# Altium integrated library GPDSE.IntLib: 634 symbols (part 2 of 7) (continued)
## SN74S112 (continued)
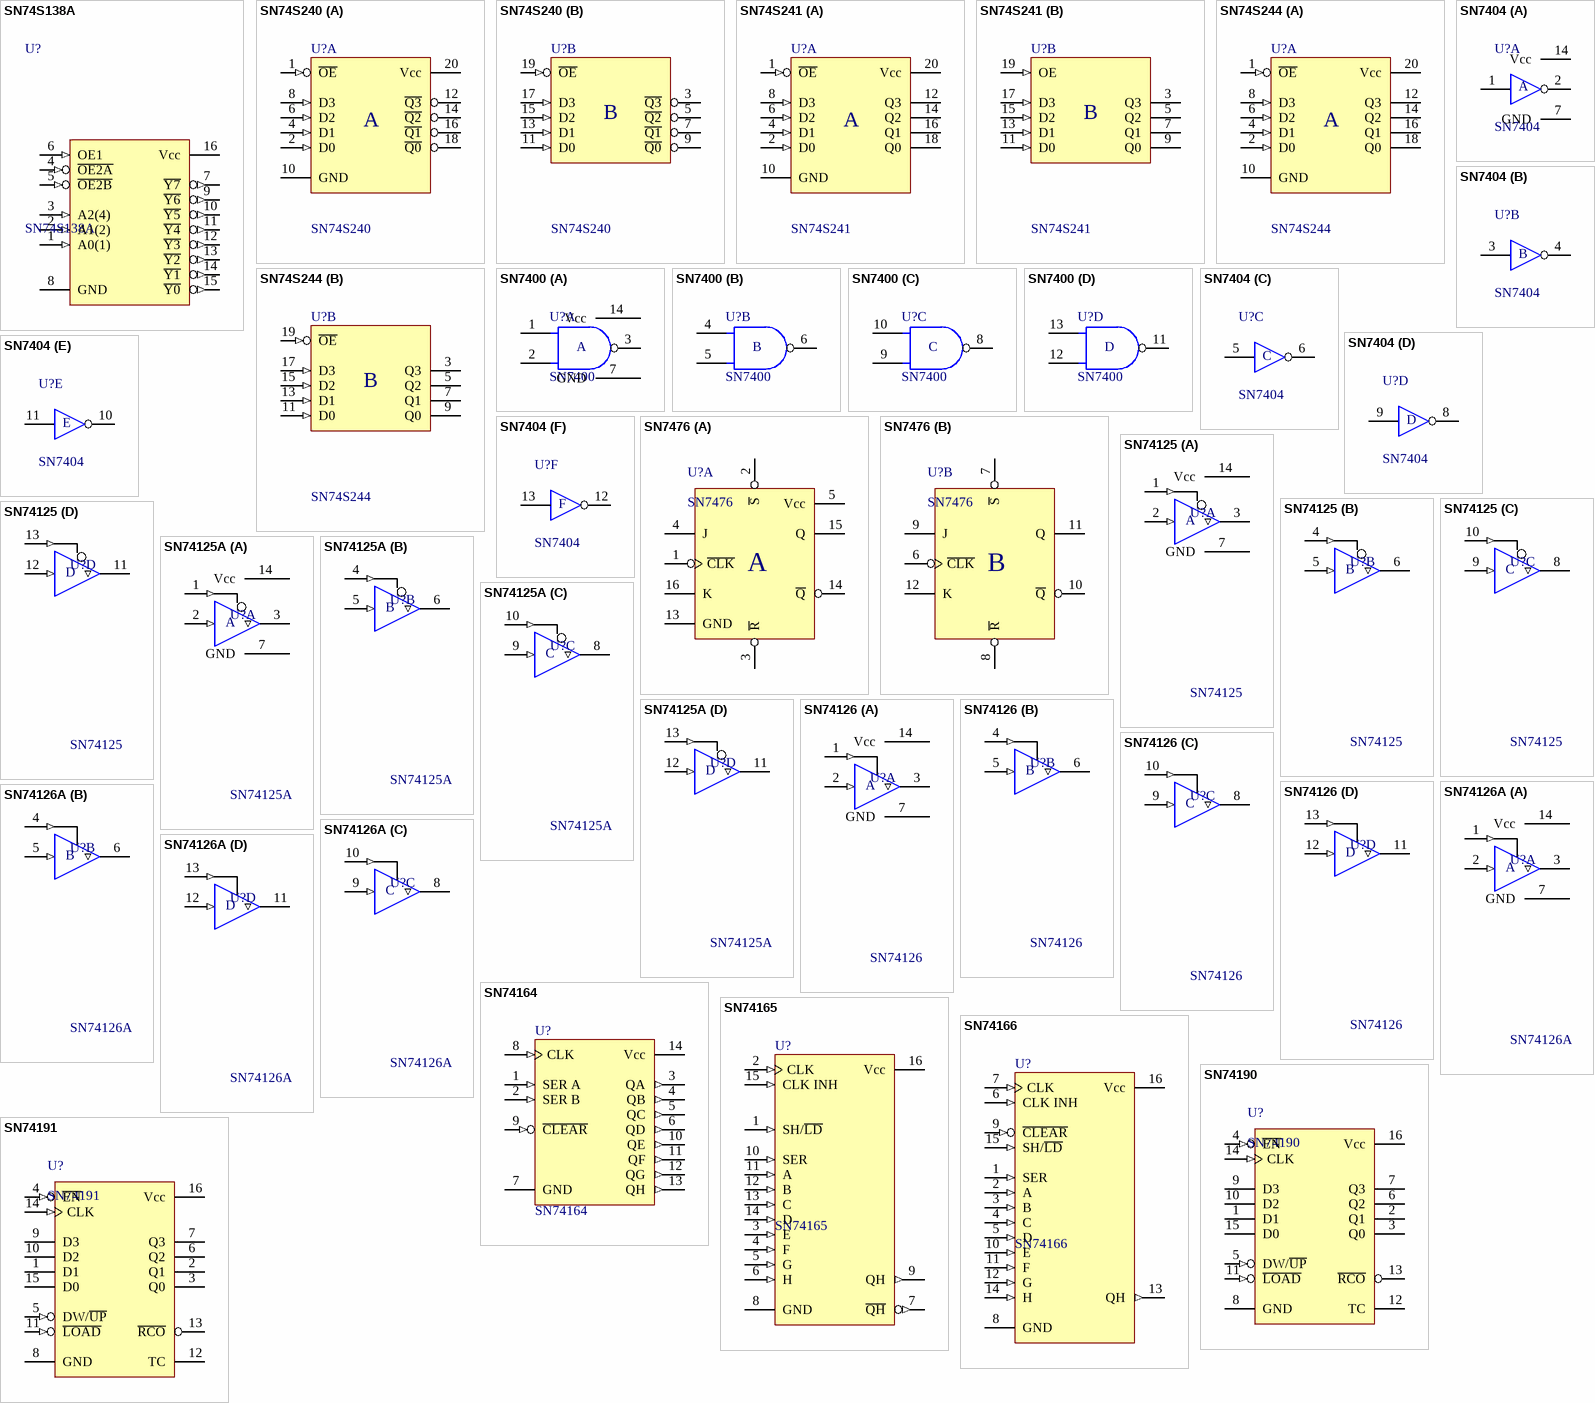
[diagram p6: symbols SN74S138A to SN74191]
part A text: A
part B text: B

## SN74S138A
designator U?
[TI] 3-Line to 8-Line Decoder / Demultiplexer; Output Voltage (Vo): 0 to Vcc; Supply Voltage (Vcc): 4.75 to 5.25 V; Propagation Delay High-Low (tphl): 8ns; Propagation Delay Low-High (tplh): 7.5ns; Output High Current (Ioh): -1 mA; Output Low Current (Iol): 20 mA; Input Voltage (Vi): 0 to Vcc
footprint DIP16-300(100) (Footprint not found)
footprint SOIC16-150(50) (Plastic Small Outline 16 pinos)
pins: 1 A0(1) (in), 2 A1(2) (in), 3 A2(4) (in), 4 ~{OE2A} (in), 5 ~{OE2B} (in), 6 OE1 (in), 7 ~{Y7} (out), 8 GND (power), 9 ~{Y6} (out), 10 ~{Y5} (out), 11 ~{Y4} (out), 12 ~{Y3} (out), 13 ~{Y2} (out), 14 ~{Y1} (out), 15 ~{Y0} (out), 16 Vcc (power)

## SN74S240
designator U?
[TI] Octal Buffer/Driver with 3-State Outputs; Supply Voltage (Vcc): 4.75 to 5.25 V; Input Voltage (Vi): 0 to Vcc; Output High Current (Ioh): -15 mA; Output Low Current (Iol): 64 mA; Propagation Delay (tpd): 10ns; Output Voltage (Vo): 0 to Vcc
footprint SOIC20-300(50) (SOIC 20 Leads; Row Spacing 7.62 mm; Pitch 1.27 mm; 3D André L´Hérault)
footprint DIP20-300(100) (Footprint not found)
part A pins: 1 ~{OE} (in), 2 D0 (in), 4 D1 (in), 6 D2 (in), 8 D3 (in), 10 GND (power), 12 ~{Q3} (hiz), 14 ~{Q2} (hiz), 16 ~{Q1} (hiz), 18 ~{Q0} (hiz), 20 Vcc (power)
part B pins: 3 ~{Q3} (hiz), 5 ~{Q2} (hiz), 7 ~{Q1} (hiz), 9 ~{Q0} (hiz), 11 D0 (in), 13 D1 (in), 15 D2 (in), 17 D3 (in), 19 ~{OE} (in)
part A text: A
part B text: B

## SN74S241
designator U?
[TI] Octal Buffer/Driver with 3-State Outputs; Supply Voltage (Vcc): 4.75 to 5.25 V; Input Voltage (Vi): 0 to Vcc; Output High Current (Ioh): -15 mA; Output Low Current (Iol): 64 mA; Propagation Delay (tpd): 10ns; Output Voltage (Vo): 0 to Vcc
footprint SOIC20-300(50) (SOIC 20 Leads; Row Spacing 7.62 mm; Pitch 1.27 mm; 3D André L´Hérault)
footprint DIP20-300(100) (Footprint not found)
part A pins: 1 ~{OE} (in), 2 D0 (in), 4 D1 (in), 6 D2 (in), 8 D3 (in), 10 GND (power), 12 Q3 (hiz), 14 Q2 (hiz), 16 Q1 (hiz), 18 Q0 (hiz), 20 Vcc (power)
part B pins: 3 Q3 (hiz), 5 Q2 (hiz), 7 Q1 (hiz), 9 Q0 (hiz), 11 D0 (in), 13 D1 (in), 15 D2 (in), 17 D3 (in), 19 OE (in)
part A text: A
part B text: B

## SN74S244
designator U?
[TI] Octal Buffer/Driver with 3-State Outputs; Supply Voltage (Vcc): 4.75 to 5.25 V; Input Voltage (Vi): 0 to Vcc; Output High Current (Ioh): -15 mA; Output Low Current (Iol): 64 mA; Propagation Delay (tpd): 10ns; Output Voltage (Vo): 0 to Vcc
footprint SOIC20-300(50) (SOIC 20 Leads; Row Spacing 7.62 mm; Pitch 1.27 mm; 3D André L´Hérault)
footprint DIP20-300(100) (Footprint not found)
part A pins: 1 ~{OE} (in), 2 D0 (in), 4 D1 (in), 6 D2 (in), 8 D3 (in), 10 GND (power), 12 Q3 (hiz), 14 Q2 (hiz), 16 Q1 (hiz), 18 Q0 (hiz), 20 Vcc (power)
part B pins: 3 Q3 (hiz), 5 Q2 (hiz), 7 Q1 (hiz), 9 Q0 (hiz), 11 D0 (in), 13 D1 (in), 15 D2 (in), 17 D3 (in), 19 ~{OE} (in)
part A text: A
part B text: B

## SN7400
designator U?
[TI] Quad 2-Input NAND Gate; Supply Voltage (Vcc): 4.75 to 5.25 V; Input Voltage (Vi): 0 to Vcc; Output High Current (Ioh): -0.4 mA; Output Low Current (Iol): 16 mA; Propagation Delay High-Low (tphl): 7ns; Propagation Delay Low-High (tplh): 11ns; Output Voltage (Vo): 0 to Vcc
footprint DIP14-300(100) (DIP, 14-Leads, Row Spacing 7.62mm, Pitch 2.54mm)
footprint SOIC14-150(50) (SOIC 14 Leads; Row Spacing 3.81 mm; Pitch 1.27 mm; 3D André L´Hérault)
footprint SOP14-5.3mm(1.27mm) (Small Outline Package 14 pin)
part A pins: 1 A0, 2 B0, 3 Y0, 7 GND, 14 Vcc
part B pins: 4 A1, 5 B1, 6 Y1
part C pins: 8 Y2, 9 B2, 10 A2
part D pins: 11 Y3, 12 B3, 13 A3
part A text: A
part B text: B
part C text: C
part D text: D

## SN7404
designator U?
[TI] Hex Logic Inverter; Input Voltage (Vi): 0 to Vcc; Output High Current (Ioh): -0.4 mA; Output Low Current (Iol): 16 mA; Propagation Delay High-Low (tphl): 8ns; Propagation Delay Low-High (tplh): 12ns; Supply Voltage (Vcc): 4.75 to 5.25 V; Output Voltage (Vo): 0 to Vcc
footprint DIP14-300(100) (DIP, 14-Leads, Row Spacing 7.62mm, Pitch 2.54mm)
footprint SOIC14-150(50) (Plastic Small Outline 14 pinos)
footprint SOP14-5.3mm(1.27mm) (Small Outline Package 14 pin)
part A pins: 1 2A, 2 2Y, 7 GND (power), 14 Vcc (power)
part B pins: 3 2A, 4 2Y
part C pins: 5 3A, 6 3Y
part D pins: 8 4Y, 9 4A
part E pins: 10 5Y, 11 5A
part F pins: 12 6Y, 13 6A
part A text: A
part B text: B
part C text: C
part D text: D
part E text: E
part F text: F

## SN7476
designator U?
Dual JK Flip-Flop with Preset and Clear
footprint DIP16-300(100) (DIP, 16-Leads, Row Spacing 7.62mm, Pitch 2.54mm, Body 22.86x6.35mm)
part A pins: 1 ~{CLK}, 2 ~{S}, 3 ~{R}, 4 J, 5 Vcc (power), 13 GND (power), 14 ~{Q}, 15 Q, 16 K
part B pins: 6 ~{CLK}, 7 ~{S}, 8 ~{R}, 9 J, 10 ~{Q}, 11 Q, 12 K
part A text: A
part B text: B

## SN74125
designator U?
[TI] Quadruple Bus Buffer Gates with 3-State Outputs; Supply Voltage (Vcc): 4.75 to 5.25 V; Input Voltage (Vi): 0 to Vcc; Output High Current (Ioh): -2.6 mA; Output Low Current (Iol): 24 mA; Propagation Delay (tpd): 12ns; Output Voltage (Vo): 0 to Vcc
footprint DIP14-300(100) (DIP, 14-Leads, Row Spacing 7.62mm, Pitch 2.54mm)
part A pins: 1 ~{OE1} (in), 2 A1 (in), 3 Y1 (hiz), 7 GND, 14 Vcc
part B pins: 4 ~{OE2} (in), 5 A2 (in), 6 Y2 (hiz)
part C pins: 8 Y3 (hiz), 9 A3 (in), 10 ~{OE3} (in)
part D pins: 11 Y4 (hiz), 12 A4 (in), 13 ~{OE4} (in)
part A text: A
part B text: B
part C text: C
part D text: D

## SN74125A
designator U?
[TI] Quadruple Bus Buffer Gates with 3-State Outputs; Supply Voltage (Vcc): 4.75 to 5.25 V; Input Voltage (Vi): 0 to Vcc; Output High Current (Ioh): -2.6 mA; Output Low Current (Iol): 24 mA; Propagation Delay (tpd): 12ns; Output Voltage (Vo): 0 to Vcc
footprint DIP14-300(100) (DIP, 14-Leads, Row Spacing 7.62mm, Pitch 2.54mm)
footprint SOIC14-150(50) (SOIC 14 Leads; Row Spacing 3.81 mm; Pitch 1.27 mm; 3D André L´Hérault)
footprint SOP14-5.3mm(0.65mm) (Small Outline Package 14 pin)
footprint SOP14-5.3mm(1.27mm) (Small Outline Package 14 pin)
part A pins: 1 ~{OE1} (in), 2 A1 (in), 3 Y1 (hiz), 7 GND, 14 Vcc
part B pins: 4 ~{OE2} (in), 5 A2 (in), 6 Y2 (hiz)
part C pins: 8 Y3 (hiz), 9 A3 (in), 10 ~{OE3} (in)
part D pins: 11 Y4 (hiz), 12 A4 (in), 13 ~{OE4} (in)
part A text: A
part B text: B
part C text: C
part D text: D

## SN74126
designator U?
[TI] Quadruple Bus Buffer Gates with 3-State Outputs; Supply Voltage (Vcc): 4.75 to 5.25 V; Input Voltage (Vi): 0 to Vcc; Output High Current (Ioh): -2.6 mA; Output Low Current (Iol): 24 mA; Propagation Delay (tpd): 12ns; Output Voltage (Vo): 0 to Vcc
footprint DIP14-300(100) (DIP, 14-Leads, Row Spacing 7.62mm, Pitch 2.54mm)
part A pins: 1 OE1 (in), 2 A1 (in), 3 Y1 (hiz), 7 GND, 14 Vcc
part B pins: 4 OE2 (in), 5 A2 (in), 6 Y2 (hiz)
part C pins: 8 Y3 (hiz), 9 A3 (in), 10 OE3 (in)
part D pins: 11 Y4 (hiz), 12 A4 (in), 13 OE4 (in)
part A text: A
part B text: B
part C text: C
part D text: D

## SN74126A
designator U?
[TI] Quadruple Bus Buffer Gates with 3-State Outputs; Supply Voltage (Vcc): 4.75 to 5.25 V; Input Voltage (Vi): 0 to Vcc; Output High Current (Ioh): -2.6 mA; Output Low Current (Iol): 24 mA; Propagation Delay (tpd): 12ns; Output Voltage (Vo): 0 to Vcc
footprint DIP14-300(100) (DIP, 14-Leads, Row Spacing 7.62mm, Pitch 2.54mm)
footprint SOIC14-150(50) (SOIC 14 Leads; Row Spacing 3.81 mm; Pitch 1.27 mm; 3D André L´Hérault)
footprint SOP14-5.3mm(1.27mm) (Small Outline Package 14 pin)
part A pins: 1 OE1 (in), 2 A1 (in), 3 Y1 (hiz), 7 GND, 14 Vcc
part B pins: 4 OE2 (in), 5 A2 (in), 6 Y2 (hiz)
part C pins: 8 Y3 (hiz), 9 A3 (in), 10 OE3 (in)
part D pins: 11 Y4 (hiz), 12 A4 (in), 13 OE4 (in)
part A text: A
part B text: B
part C text: C
part D text: D

## SN74164
designator U?
[TI] 8-bit Parallel-Out Serial Shift Registers; Supply Voltage (Vcc): 4.75 to 5.25 V; Input Voltage (Vi): 0 to Vcc; Output High Current (Ioh): -0.8 mA; Output Low Current (Iol): 16 mA; Clock Frequency (fclock): 20 MHz; Output Voltage (Vo): 0 to Vcc
footprint DIP14-300(100) (DIP, 14-Leads, Row Spacing 7.62mm, Pitch 2.54mm)
pins: 1 SER A (in), 2 SER B (in), 3 QA (out), 4 QB (out), 5 QC (out), 6 QD (out), 7 GND (power), 8 CLK (in), 9 ~{CLEAR} (in), 10 QE (out), 11 QF (out), 12 QG (out), 13 QH (out), 14 Vcc (power)

## SN74165
designator U?
[TI] Parallel-Load 8-bit Shift Registers; Supply Voltage (Vcc): 4.75 to 5.25 V; Input Voltage (Vi): 0 to Vcc; Output High Current (Ioh): -0.8 mA; Output Low Current (Iol): 16 mA; Clock Frequency (fclock): 20 MHz; Output Voltage (Vo): 0 to Vcc
footprint DIP16-300(100) (DIP, 16-Leads, Row Spacing 7.62mm, Pitch 2.54mm, Body 22.86x6.35mm)
pins: 1 SH/~{LD} (in), 2 CLK (in), 3 E (in), 4 F (in), 5 G (in), 6 H (in), 7 ~{QH} (out), 8 GND (power), 9 QH (out), 10 SER (in), 11 A (in), 12 B (in), 13 C (in), 14 D (in), 15 CLK INH (in), 16 Vcc (power)

## SN74166
designator U?
[TI] Parallel-Load 8-bit Shift Registers; Supply Voltage (Vcc): 4.75 to 5.25 V; Input Voltage (Vi): 0 to Vcc; Output High Current (Ioh): -0.8 mA; Output Low Current (Iol): 16 mA; Clock Frequency (fclock): 20 MHz; Output Voltage (Vo): 0 to Vcc
footprint DIP16-300(100) (DIP, 16-Leads, Row Spacing 7.62mm, Pitch 2.54mm, Body 22.86x6.35mm)
pins: 1 SER (in), 2 A (in), 3 B (in), 4 C (in), 5 D (in), 6 CLK INH (in), 7 CLK (in), 8 GND (power), 9 ~{CLEAR} (in), 10 E (in), 11 F (in), 12 G (in), 13 QH (out), 14 H (in), 15 SH/~{LD} (in), 16 Vcc (power)

## SN74190
designator U?
[TI] Synchronous Up/Down BCD Decade Counter with Down/Up Mode Control
footprint DIP16-300(100) (DIP; 16 Leads; Row Spacing 7.62 mm; Pitch 2.54 mm; 3D CircuitWorks)
pins: 1 D1, 2 Q1, 3 Q0, 4 ~{EN} (in), 5 DW/~{UP} (in), 6 Q2, 7 Q3, 8 GND, 9 D3, 10 D2, 11 ~{LOAD} (in), 12 TC, 13 ~{RCO}, 14 CLK (in), 15 D0, 16 Vcc

## SN74191
designator U?
[TI] Synchronous Up/Down 4-Bits Counter with Down/Up Mode Control
footprint DIP16-300(100) (DIP; 16 Leads; Row Spacing 7.62 mm; Pitch 2.54 mm; 3D CircuitWorks)
pins: 1 D1, 2 Q1, 3 Q0, 4 ~{EN} (in), 5 DW/~{UP} (in), 6 Q2, 7 Q3, 8 GND, 9 D3, 10 D2, 11 ~{LOAD} (in), 12 TC, 13 ~{RCO}, 14 CLK (in), 15 D0, 16 Vcc


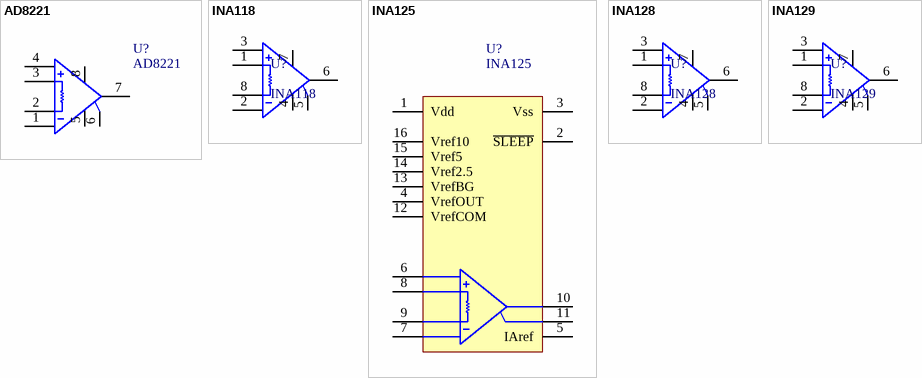
[diagram p7: symbols AD8221 to INA129]

## AD8221
designator U?
Precision Instrumentation Amplifier
footprint SOIC08-150(50) (Plastic Small Outline 8 pinos)
footprint SOP08-2.8mm(0.65mm) (Small Outline Package; 8 leads; Row Spacing 2.8 mm; Pitch 0.65 mm)
pins: 1 Vin-, 2 Rg-, 3 Rg+, 4 Vin+, 5 V-, 6 REF, 7 OUT, 8 V+

## INA118
designator U?
Precision, Low Power Instrumentation Amplifier
footprint DIP08-300(100) (DIP; 8 Leads; Row Spacing 7.62 mm; Pitch 2.54 mm)
footprint SOIC08-150(50) (SOIC 8 Leads; Row Spacing 3.81 mm; Pitch 1.27 mm; 3D André L´Hérault)
pins: 1 Rg+, 2 Vin-, 3 Vin+, 4 V-, 5 REF, 6 OUT, 7 V+, 8 Rg-

## INA125
designator U?
Instrumentation Amplifier with Precision Voltage Reference
footprint DIP16-300(100) (DIP, 16-Leads, Row Spacing 7.62mm, Pitch 2.54mm, Body 22.86x6.35mm)
footprint SOIC16-150(50) (Plastic Small Outline 16 pinos)
pins: 1 Vdd, 2 ~{SLEEP}, 3 Vss, 4 VrefOUT, 5 IAref, 6 Vin+, 7 Vin-, 8 RG, 9 RG, 10 Vo, 11 Sense, 12 VrefCOM, 13 VrefBG, 14 Vref2.5, 15 Vref5, 16 Vref10

## INA128
designator U?
Precision, Low Power Instrumentation Amplifier
footprint DIP08-300(100) (DIP; 8 Leads; Row Spacing 7.62 mm; Pitch 2.54 mm)
footprint SOIC08-150(50) (SOIC 8 Leads; Row Spacing 3.81 mm; Pitch 1.27 mm; 3D André L´Hérault)
pins: 1 Rg+, 2 Vin-, 3 Vin+, 4 V-, 5 REF, 6 OUT, 7 V+, 8 Rg-

## INA129
designator U?
Precision, Low Power Instrumentation Amplifier
footprint DIP08-300(100) (DIP; 8 Leads; Row Spacing 7.62 mm; Pitch 2.54 mm)
footprint SOIC08-150(50) (SOIC 8 Leads; Row Spacing 3.81 mm; Pitch 1.27 mm; 3D André L´Hérault)
pins: 1 Rg+, 2 Vin-, 3 Vin+, 4 V-, 5 REF, 6 OUT, 7 V+, 8 Rg-


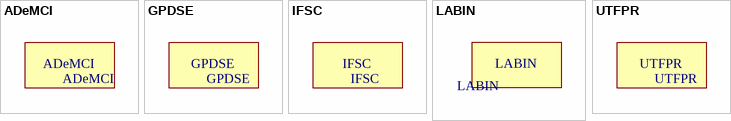
[diagram p8: symbols ADeMCI to UTFPR]

## ADeMCI
designator X?
ADeMCI trademark
footprint ADEMCI_SILK (ADEMCI trademark)
footprint ADEMCI_TOP (ADEMCI trademark)
footprint ADEMCI_BOTTOM (ADEMCI trademark)

## GPDSE
designator X?
GPDSE trademark
footprint GPDSE_SILK (GPDSE trademark)
footprint GPDSE_TOP (GPDSE trademark)
footprint GPDSE_BOTTOM (GPDSE trademark)

## IFSC
designator X?
IFSC trademark
footprint IFSC_SILK_LARGE (IFSC trademark large size)
footprint IFSC_BOTTOM_LARGE (IFSC trademark large size)
footprint IFSC_TOP_LARGE (IFSC trademark large size)
footprint IFSC_SILK_SMALL (IFSC trademark small size)
footprint IFSC_BOTTOM_SMALL (IFSC trademark small size)
footprint IFSC_TOP_SMALL (IFSC trademark small size)

## LABIN
designator X?
LABIN trademark
footprint LABIN_SILK (Logomarca do LABIN)
footprint LABIN_BOTTOM (Logomarca do LABIN)
footprint LABIN_TOP (Logomarca do LABIN)

## UTFPR
designator X?
UTFPR trademark
footprint UTFPR_SILK (Logomarca da UTFPR)
footprint UTFPR_BOTTOM (Logomarca da UTFPR)
footprint UTFPR_TOP (Logomarca da UTFPR)


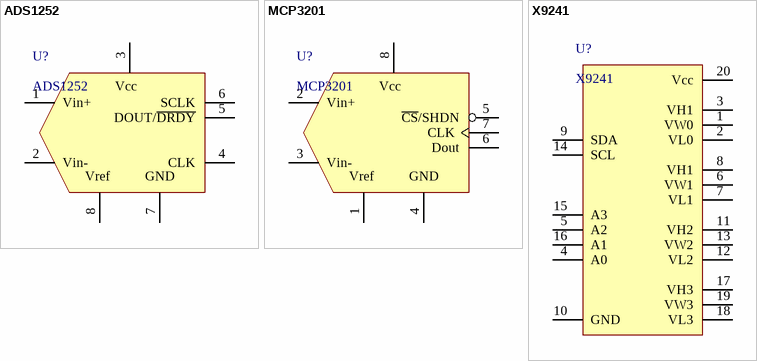
[diagram p9: symbols ADS1252 to X9241]

## ADS1252
designator U?
24-bit 40 kHz Analog to Digital Converter (ADC)
footprint SOIC08-150(50) (SOIC 8 Leads; Row Spacing 3.81 mm; Pitch 1.27 mm; 3D André L´Hérault)
pins: 1 Vin+, 2 Vin-, 3 Vcc, 4 CLK, 5 DOUT/~{DRDY}, 6 SCLK, 7 GND, 8 Vref

## MCP3201
designator U?
12-bit A/D Converter with SPI Serial Interface
footprint SOIC08-150(50) (SOIC 8 Leads; Row Spacing 3.81 mm; Pitch 1.27 mm; 3D André L´Hérault)
footprint SOP08-4.4mm(0.65mm) (Thin Shrink Small Outline Package 8 pin)
footprint SOP08-2.8mm(0.65mm) (Small Outline Package; 8 leads; Row Spacing 2.8 mm; Pitch 0.65 mm)
footprint DIP08-300(100) (DIP; 8 Leads; Row Spacing 7.62 mm; Pitch 2.54 mm)
pins: 1 Vref, 2 Vin+, 3 Vin-, 4 Vss, 5 ~{CS}/SHDN, 6 Dout, 7 CLK, 8 Vdd
text: Vcc; GND

## X9241
designator U?
Quad E2POT Nonvolatile Digital Potentiometer
footprint DIP20-300(100) (DIP, 20-Leads, Row Spacing 7.62mm, Pitch 2.54mm, Body 22.86x6.35mm)
footprint SOIC20-300(50) (SOIC 20 Leads; Row Spacing 7.62 mm; Pitch 1.27 mm; 3D André L´Hérault)
footprint SOP20-4.4mm(0.65mm) (Thin Shrink Small Outline Package 20 pin)
pins: 1 VW0, 2 VL0, 3 VH1, 4 A0, 5 A2, 6 VW1, 7 VL1, 8 VH1, 9 SDA, 10 GND, 11 VH2, 12 VL2, 13 VW2, 14 SCL, 15 A3, 16 A1, 17 VH3, 18 VL3, 19 VW3, 20 Vcc


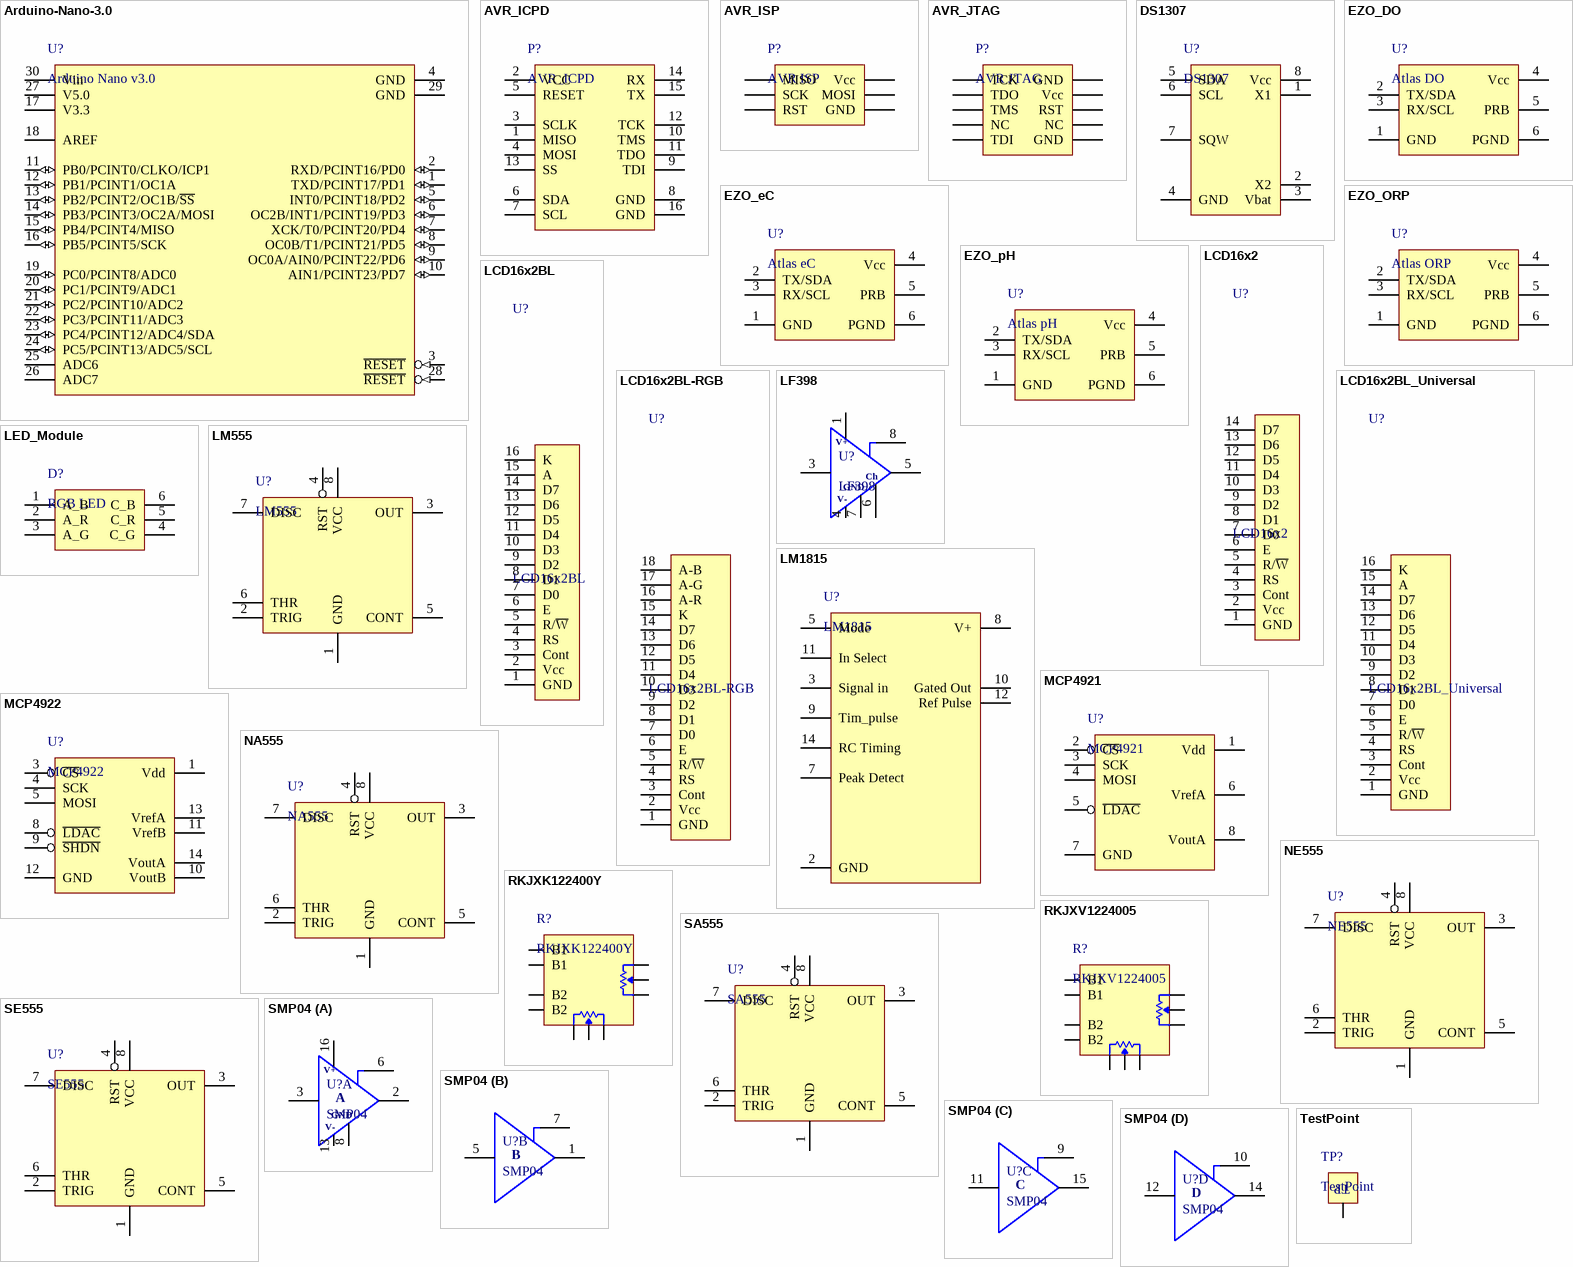
[diagram p10: symbols Arduino-Nano-3.0 to TestPoint]

## Arduino-Nano-3.0
designator U?, comment Arduino Nano v3.0
footprint Arduino-Nano-3.0 (Arduino Nano v3.0; 3D Oleg Lyan)
pins: 1 TXD/PCINT17/PD1 (io), 2 RXD/PCINT16/PD0 (io), 3 ~{RESET} (in), 4 GND, 5 INT0/PCINT18/PD2 (io), 6 OC2B/INT1/PCINT19/PD3 (io), 7 XCK/T0/PCINT20/PD4 (io), 8 OC0B/T1/PCINT21/PD5 (io), 9 OC0A/AIN0/PCINT22/PD6 (io), 10 AIN1/PCINT23/PD7 (io), 11 PB0/PCINT0/CLKO/ICP1 (io), 12 PB1/PCINT1/OC1A (io), 13 PB2/PCINT2/OC1B/~{SS} (io), 14 PB3/PCINT3/OC2A/MOSI (io), 15 PB4/PCINT4/MISO (io), 16 PB5/PCINT5/SCK (io), 17 V3.3, 18 AREF, 19 PC0/PCINT8/ADC0 (io), 20 PC1/PCINT9/ADC1 (io), 21 PC2/PCINT10/ADC2 (io), 22 PC3/PCINT11/ADC3 (io), 23 PC4/PCINT12/ADC4/SDA (io), 24 PC5/PCINT13/ADC5/SCL (io), 25 ADC6, 26 ADC7, 27 V5.0, 28 ~{RESET} (in), 29 GND, 30 Vin

## AVR_ICPD
designator P?
AVR Interface for Comunication, Program and Debug
footprint HDR-M-2x8-2.54mm-180-9.2mm (Male Header, 2 lines, 8 columns, 180 degrees, 9.2 mm length)
footprint DB15F (DB15 Female Connector)
pins: 1 MISO, 2 VCC, 3 SCLK, 4 MOSI, 5 RESET, 6 SDA, 7 SCL, 8 GND, 9 TDI, 10 TMS, 11 TDO, 12 TCK, 13 SS, 14 RX, 15 TX, 16 GND

## AVR_ISP
designator P?, comment AVR ISP
ARV ISP Connector
footprint HDR-M-2x3-2.54mm-180-9.2mm (Male Header, 2 lines, 3 columns, 180 degrees, 9.2 mm length)
pins: 1 MISO, 2 Vcc, 3 SCK, 4 MOSI, 5 RST, 6 GND

## AVR_JTAG
designator P?, comment AVR JTAG
ARV JTAG Connector
footprint HDR-M-2x5-2.54mm-180-9.2mm (Male Header, 2 lines, 5 columns, 180 degrees, 9.2 mm length)
pins: 1 TCK, 2 GND, 3 TDO, 4 Vcc, 5 TMS, 6 RST, 7 NC, 8 NC, 9 TDI, 10 GND

## DS1307
designator U?
64x8 Serial I2C Real-Time Clock
footprint DIP08-300(100) (DIP; 8 Leads; Row Spacing 7.62 mm; Pitch 2.54 mm)
footprint SOIC08-150(50) (SOIC 8 Leads; Row Spacing 3.81 mm; Pitch 1.27 mm; 3D André L´Hérault)
pins: 1 X1, 2 X2, 3 Vbat, 4 GND, 5 SDA, 6 SCL, 7 SQW, 8 Vcc

## EZO_DO
designator U?, comment Atlas DO
Atlas Scientific EZO Dissolved Oxigen Sensor
footprint EZO_DO (Atlas Scientific EZO DO Sensor)
pins: 1 GND, 2 TX/SDA, 3 RX/SCL, 4 Vcc, 5 PRB, 6 PGND

## EZO_eC
designator U?, comment Atlas eC
Atlas Scientific EZO Electro Conductibility Sensor
footprint EZO_eC (Atlas Scientific EZO eC Sensor)
pins: 1 GND, 2 TX/SDA, 3 RX/SCL, 4 Vcc, 5 PRB, 6 PGND

## EZO_ORP
designator U?, comment Atlas ORP
Atlas Scientific EZO Oxidation-Reduction Potential Sensor
footprint EZO_ORP (Atlas Scientific EZO ORP Sensor)
pins: 1 GND, 2 TX/SDA, 3 RX/SCL, 4 Vcc, 5 PRB, 6 PGND

## EZO_pH
designator U?, comment Atlas pH
Atlas Scientific EZO pH Sensor
footprint EZO_pH (Atlas Scientific EZO pH Sensor)
pins: 1 GND, 2 TX/SDA, 3 RX/SCL, 4 Vcc, 5 PRB, 6 PGND

## LCD16x2
designator U?
Liquid Crystal Display Character 16x2
footprint LCD16x2-14D-C (Display de Cristal Liquido 16x2)
footprint LCD16x2-14D-M (Display de Cristal Liquido 16x2)
footprint LCD16x2-14L-C (Display de Cristal Liquido 16x2)
footprint LCD16x2-14L-M (Display de Cristal Liquido 16x2)
pins: 1 GND, 2 Vcc, 3 Cont, 4 RS, 5 R/~{W}, 6 E, 7 D0, 8 D1, 9 D2, 10 D3, 11 D4, 12 D5, 13 D6, 14 D7

## LCD16x2BL
designator U?
Liquid Crystal Display Character 16x2 with Backlight
footprint LCD16x2-16D-C (Liquid Crystal Display Character 16x2 with Backlight, Dual Columns, Header)
footprint LCD16x2-16D-M (Liquid Crystal Display Character 16x2 with Backlight, Dual Columns, Module)
footprint LCD16x2-16L-C (Display de Cristal Liquido 16x2 com Backlight)
footprint LCD16x2-16L-C2 (Display de Cristal Liquido 16x2 com Backlight)
footprint LCD16x2-16L-M (Display de Cristal Liquido 16x2 com Backlight)
footprint LCD16x2-16L-M2 (Display de Cristal Liquido 16x2 com Backlight)
footprint LCD_16x2_BL_Universal (Liquid Crystal Display Character 16x2 with Backlight, Universal, Module)
footprint LCD16x2-RT162-7 (Display de Cristal Liquido 16x2)
pins: 1 GND, 2 Vcc, 3 Cont, 4 RS, 5 R/~{W}, 6 E, 7 D0, 8 D1, 9 D2, 10 D3, 11 D4, 12 D5, 13 D6, 14 D7, 15 A, 16 K

## LCD16x2BL-RGB
designator U?
Liquid Crystal Display Character 16x2 with RGB Backlight
footprint LCD16x2-18L-C (Display de Cristal Liquido 16x2 com Backlight RGB)
footprint LCD16x2-18L-M (Display de Cristal Liquido 16x2 com Backlight RGB)
pins: 1 GND, 2 Vcc, 3 Cont, 4 RS, 5 R/~{W}, 6 E, 7 D0, 8 D1, 9 D2, 10 D3, 11 D4, 12 D5, 13 D6, 14 D7, 15 K, 16 A-R, 17 A-G, 18 A-B

## LCD16x2BL_Universal
designator U?
Liquid Crystal Display Character 16x2 with Backlight
footprint LCD_16x2_BL_Universal (Liquid Crystal Display Character 16x2 with Backlight, Universal, Module)
pins: 1 GND, 2 Vcc, 3 Cont, 4 RS, 5 R/~{W}, 6 E, 7 D0, 8 D1, 9 D2, 10 D3, 11 D4, 12 D5, 13 D6, 14 D7, 15 A, 16 K

## LED_Module
designator D?, comment RGB LED
RGB LED Module
footprint LED_Module (RGB LED Module)
pins: 1 A_B, 2 A_R, 3 A_G, 4 C_G, 5 C_R, 6 C_B

## LF398
designator U?
Monolithic Sample-and-Hold Circuit
footprint DIP08-300(100) (DIP; 8 Leads; Row Spacing 7.62 mm; Pitch 2.54 mm)
footprint SOIC14-150(50) (SOIC 14 Leads; Row Spacing 3.81 mm; Pitch 1.27 mm; 3D André L´Hérault); pin to pad 1>12 3>1 4>3 5>7 6>8 7>10 8>11
pins: 1 V+, 3 IN, 4 V-, 5 OUT, 6 Ch, 7 GND, 8 S/H

## LM555
designator U?
LM555 Timer
footprint DIP08-300(100) (DIP; 8 Leads; Row Spacing 7.62 mm; Pitch 2.54 mm; 3D CircuitWorks)
footprint SOIC08-150(50) (SOIC; 8 Leads; Row Spacing 3.81 mm; Pitch 1.27 mm; 3D Antonio Fagaldo)
footprint SOP08-2.8mm(0.65mm) (Small Outline Package; 8 leads; Row Spacing 2.8 mm; Pitch 0.65 mm)
pins: 1 GND (power), 2 TRIG, 3 OUT, 4 RST, 5 CONT, 6 THR, 7 DISC (oc), 8 VCC (power)

## LM1815
designator U?
Adaptive Variable Reluctance Sensor Amplifier
footprint DIP14-300(100) (DIP, 14-Leads, Row Spacing 7.62mm, Pitch 2.54mm)
footprint SOIC14-150(50) (Small Outline Integrated Circuit Package; 14 leads; Row Spacing 150 mils; Pitch 50 mils)
pins: 2 GND, 3 Signal in, 5 Mode, 7 Peak Detect, 8 V+, 9 Tim_pulse, 10 Gated Out, 11 In Select, 12 Ref Pulse, 14 RC Timing

## MCP4921
designator U?
12-bit DAC with SPI Interface
footprint DIP08-300(100) (DIP; 8 Leads; Row Spacing 7.62 mm; Pitch 2.54 mm)
footprint SOIC08-150(50) (SOIC 8 Leads; Row Spacing 3.81 mm; Pitch 1.27 mm; 3D André L´Hérault)
footprint SOP08-2.8mm(0.65mm) (Small Outline Package; 8 leads; Row Spacing 2.8 mm; Pitch 0.65 mm)
pins: 1 Vdd, 2 ~{CS}, 3 SCK, 4 MOSI, 5 ~{LDAC}, 6 VrefA, 7 GND, 8 VoutA

## MCP4922
designator U?
12-bit (dual) DAC with SPI Interface
footprint DIP14-300(100) (DIP, 14-Leads, Row Spacing 7.62mm, Pitch 2.54mm)
footprint SOIC14-150(50) (SOIC 14 Leads; Row Spacing 3.81 mm; Pitch 1.27 mm; 3D André L´Hérault)
footprint SOP14-4.4mm(0.65mm) (Thin Shrink Small Outline Package 14 pin)
pins: 1 Vdd, 3 ~{CS}, 4 SCK, 5 MOSI, 8 ~{LDAC}, 9 ~{SHDN}, 10 VoutB, 11 VrefB, 12 GND, 13 VrefA, 14 VoutA

## NA555
designator U?
NA555 Precision Timers
footprint DIP08-300(100) (DIP; 8 Leads; Row Spacing 7.62 mm; Pitch 2.54 mm; 3D CircuitWorks)
footprint SOIC08-150(50) (SOIC; 8 Leads; Row Spacing 3.81 mm; Pitch 1.27 mm; 3D Antonio Fagaldo)
pins: 1 GND (power), 2 TRIG, 3 OUT, 4 RST, 5 CONT, 6 THR, 7 DISC (oc), 8 VCC (power)

## NE555
designator U?
NE555 Precision Timers
footprint DIP08-300(100) (DIP; 8 Leads; Row Spacing 7.62 mm; Pitch 2.54 mm; 3D CircuitWorks)
footprint SOIC08-150(50) (SOIC; 8 Leads; Row Spacing 3.81 mm; Pitch 1.27 mm; 3D Antonio Fagaldo)
footprint SOP08-4.4mm(0.65mm) (Thin Shrink Small Outline Package 8 pin)
footprint SOP08-5.3mm(1.27mm) (Small Outline Package 8 pin)
pins: 1 GND (power), 2 TRIG, 3 OUT, 4 RST, 5 CONT, 6 THR, 7 DISC (oc), 8 VCC (power)

## RKJXK122400Y
designator R?
Multi-Directional Switches STCK CNTRLLR W/ PUSH; Manufacturer: ALPS; Body Size: 16 mm L x 16 mm W x 12.9 mm H; Center Push: Yes; Current Rating: 50 mA at 12 VDC; Directional Operating Force: 6 mN +/- 4 mN; Directional Resolution: Contiguous; Operating Angle: 60 deg; Stem Height: 12.9 mm; Control Type: Stick Controller; Potentiometer Rated Power: 0.0125 W; Supplier 1: Mouser; Manufacturer Part Number: RKJXK122400Y; RoHS: RoHS Compliant; Category: Multi-Directional Switches; Stock 1: 492; Pricing 1: 1=11.20, 25=10.29, 50=9.40, 100=8.27, 200=7.83, 500=7.62, 1000=6.68, 2000=5.87 (AUD); Packaging: Bulk; Series: RKJXV/ RKJXK; Termination Style: PCB; Brand: ALPS; Switch Contact Rating: 50 mA at 12 VDC; Product Category: Multi-Control Switches; Standard Pack Qty: 500; Tradename: ThumbPointer; RoHS - Mouser: Y; Minimum Order Quantity: 1; Reeling: False; ComponentLink1URL: http://www.alps.com/products/WebObjects/catalog.woa/E/HTML/MultiControl/Potentiometer/RKJXK/RKJXK122400Y.html; ComponentLink1Description: http://www.alps.com/products/WebObjects/catalog.woa/E/HTML/MultiControl/Potentiometer/RKJXK/RKJXK122400Y.html; Supplier Part Number 1: 688-RKJXK122400Y
footprint RKJXK1224 (Compact Size, Standard Type, Stick Controller)
pins: 1 X1, 2 X, 3 X2, 4 Y2, 5 Y, 6 Y1, 7 B2, 8 B1, 9 B1, 10 B2

## RKJXV1224005
designator R?
Multi-Directional Switches STCK CNTRLLR W/ PUSH; Manufacturer: ALPS; Body Size: 21.28 mm L x 17.79 mm W x 18.95 mm H; Center Push: Yes; Directional Operating Force: 14 mN; Stem Height: 7.75 mm; Control Type: Stick Controller; Product Status: New Product; Supplier 1: Mouser; Manufacturer Part Number: RKJXV1224005; RoHS: RoHS Compliant; Category: Multi-Directional Switches; Stock 1: 2667; Pricing 1: 1=2.78, 25=2.52, 50=2.42, 100=2.32, 500=1.80 (AUD); Packaging: Tray; Series: RKJXV/ RKJXK; Termination Style: PCB; Brand: ALPS; RoHS - Mouser: Y; Minimum Order Quantity: 1; Reeling: False; ComponentLink1URL: http://www.alps.com/products/WebObjects/catalog.woa/E/HTML/MultiControl/Potentiometer/RKJXK/RKJXV1224005.html; ComponentLink1Description: http://www.alps.com/products/WebObjects/catalog.woa/E/HTML/MultiControl/Potentiometer/RKJXK/RKJXV1224005.html; Supplier Part Number 1: 688-RKJXV1224005
footprint RKJXV1224 (Compact Size, Standard Type, Stick Controller)
pins: 1 X1, 2 X, 3 X2, 4 Y2, 5 Y, 6 Y1, 7 B2, 8 B1, 9 B1, 10 B2

## SA555
designator U?
SA555 Precision Timers
footprint DIP08-300(100) (DIP; 8 Leads; Row Spacing 7.62 mm; Pitch 2.54 mm; 3D CircuitWorks)
footprint SOIC08-150(50) (SOIC; 8 Leads; Row Spacing 3.81 mm; Pitch 1.27 mm; 3D Antonio Fagaldo)
pins: 1 GND (power), 2 TRIG, 3 OUT, 4 RST, 5 CONT, 6 THR, 7 DISC (oc), 8 VCC (power)

## SE555
designator U?
SE555 Precision Timers
footprint DIP08-300(100) (DIP; 8 Leads; Row Spacing 7.62 mm; Pitch 2.54 mm; 3D CircuitWorks)
footprint SOIC08-150(50) (SOIC; 8 Leads; Row Spacing 3.81 mm; Pitch 1.27 mm; 3D Antonio Fagaldo)
pins: 1 GND (power), 2 TRIG, 3 OUT, 4 RST, 5 CONT, 6 THR, 7 DISC (oc), 8 VCC (power)

## SMP04
designator U?
CMOS Quad Sample-and-Hold Amplifier
footprint DIP16-300(100) (DIP, 16-Leads, Row Spacing 7.62mm, Pitch 2.54mm, Body 22.86x6.35mm)
footprint SOIC16-150(50) (SOIC 16 Leads; Row Spacing 3.81 mm; Pitch 1.27 mm; 3D André L´Hérault)
part A pins: 2 OUT, 3 IN, 6 S/H, 8 GND, 13 V-, 16 V+
part B pins: 1 OUT, 5 IN, 7 S/H
part C pins: 9 S/H, 11 IN, 15 OUT
part D pins: 10 S/H, 12 IN, 14 OUT
part A text: A
part B text: B
part C text: C
part D text: D

## TestPoint
designator TP?
Test Point
footprint TEST_POINT_PTH (Test Point PTH)
footprint TEST_POINT_TOP (Test Point SMD Top)
footprint TEST_POINT_BOTTOM (Test Point SMD Bottom)
pins: 1 TP


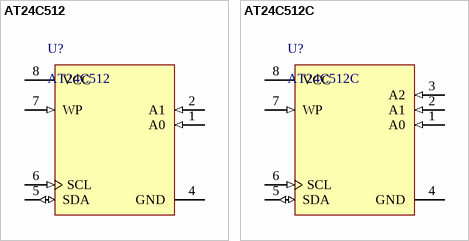
[diagram p11: symbols AT24C512 to AT24C512C]

## AT24C512
designator U?
I2C Serial EEPROM 512 Kb (65,536x8); Vcc: 1.7-5.5 V; Max. Clock: 400 kHz
footprint SOP08-4.4mm(0.65mm) (Thin Shrink Small Outline Package 8 pin)
footprint SOIC08-150(50) (SOIC 8 Leads; Row Spacing 3.81 mm; Pitch 1.27 mm; 3D André L´Hérault)
footprint DIP08-300(100) (DIP; 8 Leads; Row Spacing 7.62 mm; Pitch 2.54 mm)
pins: 1 A0 (in), 2 A1 (in), 4 GND (power), 5 SDA (io), 6 SCL (in), 7 WP (in), 8 VCC (power)

## AT24C512C
designator U?
I2C Serial EEPROM 512 Kb (65,536x8); Vcc: 1.7-5.5 V; Max. Clock: 400 kHz
footprint SOP08-4.4mm(0.65mm) (Thin Shrink Small Outline Package 8 pin)
footprint SOIC08-150(50) (SOIC 8 Leads; Row Spacing 3.81 mm; Pitch 1.27 mm; 3D André L´Hérault)
pins: 1 A0 (in), 2 A1 (in), 3 A2 (in), 4 GND (power), 5 SDA (io), 6 SCL (in), 7 WP (in), 8 VCC (power)


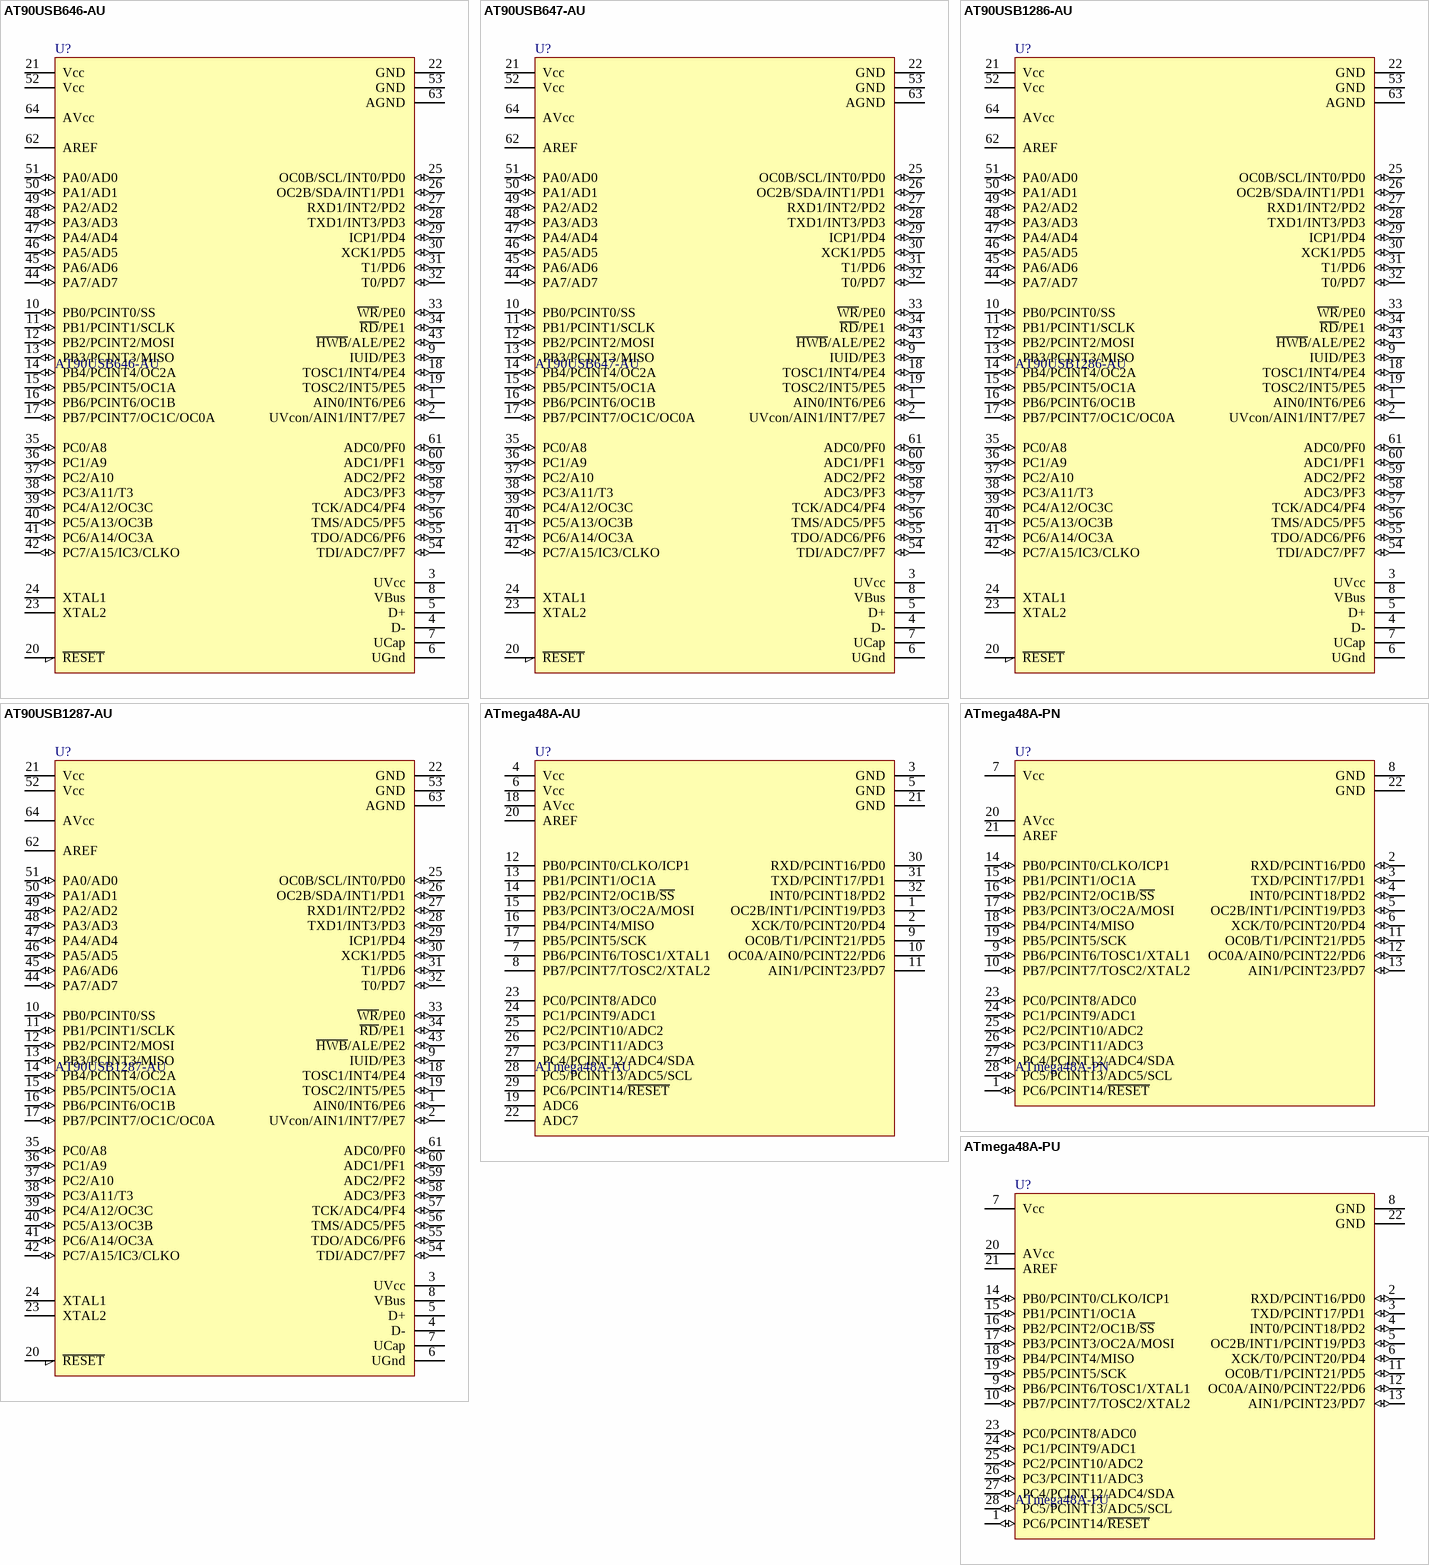
[diagram p12: symbols AT90USB646-AU to ATmega48A-PU]

## AT90USB646-AU
designator U?
8-bit Microcontroller with 64 KB of ISP Flash and USB Controller; ADC Channel: 8; Analog Comparator: 1; Clock Frequency: 0 - 16 MHz; EEPROM Memory: 2 KB; Flash Memory: 64 KB; I/O Pins: 48; PWM Channel: 10; SRAM Memory: 4 KB; Supply Voltage (Vdd): 2.7 - 5.5 V; Timer 8 bits: 2; Debug: JTAG; USB Function: Device; Serial I2C: 1; Serial SPI: 1; Serial USART: 1; Timer 16 bits: 2; USB Controller: 1
footprint QFP64-14.0mm(0.8mm)
pins: 1 AIN0/INT6/PE6 (io), 2 UVcon/AIN1/INT7/PE7 (io), 3 UVcc, 4 D-, 5 D+, 6 UGnd, 7 UCap, 8 VBus, 9 IUID/PE3 (io), 10 PB0/PCINT0/SS (io), 11 PB1/PCINT1/SCLK (io), 12 PB2/PCINT2/MOSI (io), 13 PB3/PCINT3/MISO (io), 14 PB4/PCINT4/OC2A (io), 15 PB5/PCINT5/OC1A (io), 16 PB6/PCINT6/OC1B (io), 17 PB7/PCINT7/OC1C/OC0A (io), 18 TOSC1/INT4/PE4 (io), 19 TOSC2/INT5/PE5 (io), 20 ~{RESET}, 21 Vcc, 22 GND, 23 XTAL2, 24 XTAL1, 25 OC0B/SCL/INT0/PD0 (io), 26 OC2B/SDA/INT1/PD1 (io), 27 RXD1/INT2/PD2 (io), 28 TXD1/INT3/PD3 (io), 29 ICP1/PD4 (io), 30 XCK1/PD5 (io), 31 T1/PD6 (io), 32 T0/PD7 (io), 33 ~{WR}/PE0 (io), 34 ~{RD}/PE1 (io), 35 PC0/A8 (io), 36 PC1/A9 (io), 37 PC2/A10 (io), 38 PC3/A11/T3 (io), 39 PC4/A12/OC3C (io), 40 PC5/A13/OC3B (io), 41 PC6/A14/OC3A (io), 42 PC7/A15/IC3/CLKO (io), 43 ~{HWB}/ALE/PE2 (io), 44 PA7/AD7 (io), 45 PA6/AD6 (io), 46 PA5/AD5 (io), 47 PA4/AD4 (io), 48 PA3/AD3 (io), 49 PA2/AD2 (io), 50 PA1/AD1 (io), 51 PA0/AD0 (io), 52 Vcc, 53 GND, 54 TDI/ADC7/PF7 (io), 55 TDO/ADC6/PF6 (io), 56 TMS/ADC5/PF5 (io), 57 TCK/ADC4/PF4 (io), 58 ADC3/PF3 (io), 59 ADC2/PF2 (io), 60 ADC1/PF1 (io), 61 ADC0/PF0 (io), 62 AREF, 63 AGND, 64 AVcc

## AT90USB647-AU
designator U?
8-bit Microcontroller with 64 KB of ISP Flash and USB Controller; ADC Channel: 8; Analog Comparator: 1; Clock Frequency: 0 - 16 MHz; EEPROM Memory: 2 KB; Flash Memory: 64 KB; I/O Pins: 48; PWM Channel: 10; SRAM Memory: 4 KB; Supply Voltage (Vdd): 2.7 - 5.5 V; Timer 8 bits: 2; Debug: JTAG; USB Function: OTG; Serial I2C: 1; Serial SPI: 1; Serial USART: 1; Timer 16 bits: 2; USB Controller: 1
footprint QFP64-14.0mm(0.8mm)
pins: 1 AIN0/INT6/PE6 (io), 2 UVcon/AIN1/INT7/PE7 (io), 3 UVcc, 4 D-, 5 D+, 6 UGnd, 7 UCap, 8 VBus, 9 IUID/PE3 (io), 10 PB0/PCINT0/SS (io), 11 PB1/PCINT1/SCLK (io), 12 PB2/PCINT2/MOSI (io), 13 PB3/PCINT3/MISO (io), 14 PB4/PCINT4/OC2A (io), 15 PB5/PCINT5/OC1A (io), 16 PB6/PCINT6/OC1B (io), 17 PB7/PCINT7/OC1C/OC0A (io), 18 TOSC1/INT4/PE4 (io), 19 TOSC2/INT5/PE5 (io), 20 ~{RESET}, 21 Vcc, 22 GND, 23 XTAL2, 24 XTAL1, 25 OC0B/SCL/INT0/PD0 (io), 26 OC2B/SDA/INT1/PD1 (io), 27 RXD1/INT2/PD2 (io), 28 TXD1/INT3/PD3 (io), 29 ICP1/PD4 (io), 30 XCK1/PD5 (io), 31 T1/PD6 (io), 32 T0/PD7 (io), 33 ~{WR}/PE0 (io), 34 ~{RD}/PE1 (io), 35 PC0/A8 (io), 36 PC1/A9 (io), 37 PC2/A10 (io), 38 PC3/A11/T3 (io), 39 PC4/A12/OC3C (io), 40 PC5/A13/OC3B (io), 41 PC6/A14/OC3A (io), 42 PC7/A15/IC3/CLKO (io), 43 ~{HWB}/ALE/PE2 (io), 44 PA7/AD7 (io), 45 PA6/AD6 (io), 46 PA5/AD5 (io), 47 PA4/AD4 (io), 48 PA3/AD3 (io), 49 PA2/AD2 (io), 50 PA1/AD1 (io), 51 PA0/AD0 (io), 52 Vcc, 53 GND, 54 TDI/ADC7/PF7 (io), 55 TDO/ADC6/PF6 (io), 56 TMS/ADC5/PF5 (io), 57 TCK/ADC4/PF4 (io), 58 ADC3/PF3 (io), 59 ADC2/PF2 (io), 60 ADC1/PF1 (io), 61 ADC0/PF0 (io), 62 AREF, 63 AGND, 64 AVcc